# Altium schematic symbol library jlcpcb_2025_04_resistors_extended_2512.schlib: 2667 symbols (part 11 of 14) (continued)
## RTT25R51JTE
designator R?  Resistance: 510mΩ  (hidden comment: *)
Resistor, 510mΩ, ±5%, 1W, 200V, ±200ppm/℃, -55℃~+155℃, SMD 2512; Manufacturer: Uniroyal; Manufacturer Part Number: RTT25R51JTE; Supplier 1: LCSC; Supplier Part Number 1: C305119; JLCPCB Part Number: C305119; Power Rating: 1W; Category: Resistors; Package Size: 2512; JLCPCB Basic Part: Yes; Tolerance: ±5%; Voltage Rating: 200V; Temperature Coefficient: ±200ppm/℃; Temperature Rating: -55℃~+155℃; ComponentLink1Description: Datasheet; ComponentLink1URL: https://wmsc.lcsc.com/wmsc/upload/file/pdf/v2/lcsc/2304140030_RALEC-RTT25R51JTE_C305119.pdf; ComponentLink2Description: JLCPCB Part URL; ComponentLink2URL: https://jlcpcb.com/partdetail/C305119
pins: 1, 2
1 alternate drawing of the same symbol

## RTT25R060FTE
designator R?  Resistance: 60mΩ  (hidden comment: *)
Resistor, 60mΩ, ±1%, 1W, 200V, ±500ppm/℃, -55℃~+155℃, SMD 2512; Manufacturer: Uniroyal; Manufacturer Part Number: RTT25R060FTE; Supplier 1: LCSC; Supplier Part Number 1: C333702; JLCPCB Part Number: C333702; Power Rating: 1W; Category: Resistors; Package Size: 2512; JLCPCB Basic Part: Yes; Tolerance: ±1%; Voltage Rating: 200V; Temperature Coefficient: ±500ppm/℃; Temperature Rating: -55℃~+155℃; ComponentLink1Description: Datasheet; ComponentLink1URL: https://wmsc.lcsc.com/wmsc/upload/file/pdf/v2/lcsc/2304140030_RALEC-RTT25R060FTE_C333702.pdf; ComponentLink2Description: JLCPCB Part URL; ComponentLink2URL: https://jlcpcb.com/partdetail/C333702
pins: 1, 2
1 alternate drawing of the same symbol

## RTT25R062FTE
designator R?  Resistance: 62mΩ  (hidden comment: *)
Resistor, 62mΩ, ±1%, 1W, 200V, ±500ppm/℃, -55℃~+155℃, SMD 2512; Manufacturer: Uniroyal; Manufacturer Part Number: RTT25R062FTE; Supplier 1: LCSC; Supplier Part Number 1: C305116; JLCPCB Part Number: C305116; Power Rating: 1W; Category: Resistors; Package Size: 2512; JLCPCB Basic Part: Yes; Tolerance: ±1%; Voltage Rating: 200V; Temperature Coefficient: ±500ppm/℃; Temperature Rating: -55℃~+155℃; ComponentLink1Description: Datasheet; ComponentLink1URL: https://wmsc.lcsc.com/wmsc/upload/file/pdf/v2/lcsc/2304140030_RALEC-RTT25R062FTE_C305116.pdf; ComponentLink2Description: JLCPCB Part URL; ComponentLink2URL: https://jlcpcb.com/partdetail/C305116
pins: 1, 2
1 alternate drawing of the same symbol

## RTT25R62JTE
designator R?  Resistance: 620mΩ  (hidden comment: *)
Resistor, 620mΩ, ±5%, 1W, 200V, ±200ppm/℃, -55℃~+155℃, SMD 2512; Manufacturer: Uniroyal; Manufacturer Part Number: RTT25R62JTE; Supplier 1: LCSC; Supplier Part Number 1: C159154; JLCPCB Part Number: C159154; Power Rating: 1W; Category: Resistors; Package Size: 2512; JLCPCB Basic Part: Yes; Tolerance: ±5%; Voltage Rating: 200V; Temperature Coefficient: ±200ppm/℃; Temperature Rating: -55℃~+155℃; ComponentLink1Description: Datasheet; ComponentLink1URL: https://wmsc.lcsc.com/wmsc/upload/file/pdf/v2/lcsc/2304140030_RALEC-RTT25R62JTE_C159154.pdf; ComponentLink2Description: JLCPCB Part URL; ComponentLink2URL: https://jlcpcb.com/partdetail/C159154
pins: 1, 2
1 alternate drawing of the same symbol

## RTT25R068FTE
designator R?  Resistance: 68mΩ  (hidden comment: *)
Resistor, 68mΩ, ±1%, 1W, 200V, ±500ppm/℃, -55℃~+155℃, SMD 2512; Manufacturer: Uniroyal; Manufacturer Part Number: RTT25R068FTE; Supplier 1: LCSC; Supplier Part Number 1: C333703; JLCPCB Part Number: C333703; Power Rating: 1W; Category: Resistors; Package Size: 2512; JLCPCB Basic Part: Yes; Tolerance: ±1%; Voltage Rating: 200V; Temperature Coefficient: ±500ppm/℃; Temperature Rating: -55℃~+155℃; ComponentLink1Description: Datasheet; ComponentLink1URL: https://wmsc.lcsc.com/wmsc/upload/file/pdf/v2/lcsc/2304140030_RALEC-RTT25R068FTE_C333703.pdf; ComponentLink2Description: JLCPCB Part URL; ComponentLink2URL: https://jlcpcb.com/partdetail/C333703
pins: 1, 2
1 alternate drawing of the same symbol

## RTT25R68JTE
designator R?  Resistance: 680mΩ  (hidden comment: *)
Resistor, 680mΩ, ±5%, 1W, 200V, ±200ppm/℃, -55℃~+155℃, SMD 2512; Manufacturer: Uniroyal; Manufacturer Part Number: RTT25R68JTE; Supplier 1: LCSC; Supplier Part Number 1: C159153; JLCPCB Part Number: C159153; Power Rating: 1W; Category: Resistors; Package Size: 2512; JLCPCB Basic Part: Yes; Tolerance: ±5%; Voltage Rating: 200V; Temperature Coefficient: ±200ppm/℃; Temperature Rating: -55℃~+155℃; ComponentLink1Description: Datasheet; ComponentLink1URL: https://wmsc.lcsc.com/wmsc/upload/file/pdf/v2/lcsc/2304140030_RALEC-RTT25R68JTE_C159153.pdf; ComponentLink2Description: JLCPCB Part URL; ComponentLink2URL: https://jlcpcb.com/partdetail/C159153
pins: 1, 2
1 alternate drawing of the same symbol

## RTT25R075FTE
designator R?  Resistance: 75mΩ  (hidden comment: *)
Resistor, 75mΩ, ±1%, 1W, 200V, ±500ppm/℃, -55℃~+155℃, SMD 2512; Manufacturer: Uniroyal; Manufacturer Part Number: RTT25R075FTE; Supplier 1: LCSC; Supplier Part Number 1: C333704; JLCPCB Part Number: C333704; Power Rating: 1W; Category: Resistors; Package Size: 2512; JLCPCB Basic Part: Yes; Tolerance: ±1%; Voltage Rating: 200V; Temperature Coefficient: ±500ppm/℃; Temperature Rating: -55℃~+155℃; ComponentLink1Description: Datasheet; ComponentLink1URL: https://wmsc.lcsc.com/wmsc/upload/file/pdf/v2/lcsc/2304140030_RALEC-RTT25R075FTE_C333704.pdf; ComponentLink2Description: JLCPCB Part URL; ComponentLink2URL: https://jlcpcb.com/partdetail/C333704
pins: 1, 2
1 alternate drawing of the same symbol

## RTT25R75JTE
designator R?  Resistance: 750mΩ  (hidden comment: *)
Resistor, 750mΩ, ±5%, 1W, 200V, ±200ppm/℃, -55℃~+155℃, SMD 2512; Manufacturer: Uniroyal; Manufacturer Part Number: RTT25R75JTE; Supplier 1: LCSC; Supplier Part Number 1: C159152; JLCPCB Part Number: C159152; Power Rating: 1W; Category: Resistors; Package Size: 2512; JLCPCB Basic Part: Yes; Tolerance: ±5%; Voltage Rating: 200V; Temperature Coefficient: ±200ppm/℃; Temperature Rating: -55℃~+155℃; ComponentLink1Description: Datasheet; ComponentLink1URL: https://wmsc.lcsc.com/wmsc/upload/file/pdf/v2/lcsc/2304140030_RALEC-RTT25R75JTE_C159152.pdf; ComponentLink2Description: JLCPCB Part URL; ComponentLink2URL: https://jlcpcb.com/partdetail/C159152
pins: 1, 2
1 alternate drawing of the same symbol

## RTT25R080FTE
designator R?  Resistance: 80mΩ  (hidden comment: *)
Resistor, 80mΩ, ±1%, 1W, SMD 2512; Manufacturer: Uniroyal; Manufacturer Part Number: RTT25R080FTE; Supplier 1: LCSC; Supplier Part Number 1: C881749; JLCPCB Part Number: C881749; Power Rating: 1W; Category: Resistors; Package Size: 2512; JLCPCB Basic Part: Yes; Tolerance: ±1%; ComponentLink1Description: Datasheet; ComponentLink1URL: https://wmsc.lcsc.com/wmsc/upload/file/pdf/v2/lcsc/2304140030_RALEC-RTT25R080FTE_C881749.pdf; ComponentLink2Description: JLCPCB Part URL; ComponentLink2URL: https://jlcpcb.com/partdetail/C881749
pins: 1, 2
1 alternate drawing of the same symbol

## RTT25R082FTE
designator R?  Resistance: 82mΩ  (hidden comment: *)
Resistor, 82mΩ, ±1%, 1W, 200V, ±500ppm/℃, -55℃~+155℃, SMD 2512; Manufacturer: Uniroyal; Manufacturer Part Number: RTT25R082FTE; Supplier 1: LCSC; Supplier Part Number 1: C333706; JLCPCB Part Number: C333706; Power Rating: 1W; Category: Resistors; Package Size: 2512; JLCPCB Basic Part: Yes; Tolerance: ±1%; Voltage Rating: 200V; Temperature Coefficient: ±500ppm/℃; Temperature Rating: -55℃~+155℃; ComponentLink1Description: Datasheet; ComponentLink1URL: https://wmsc.lcsc.com/wmsc/upload/file/pdf/v2/lcsc/2304140030_RALEC-RTT25R082FTE_C333706.pdf; ComponentLink2Description: JLCPCB Part URL; ComponentLink2URL: https://jlcpcb.com/partdetail/C333706
pins: 1, 2
1 alternate drawing of the same symbol

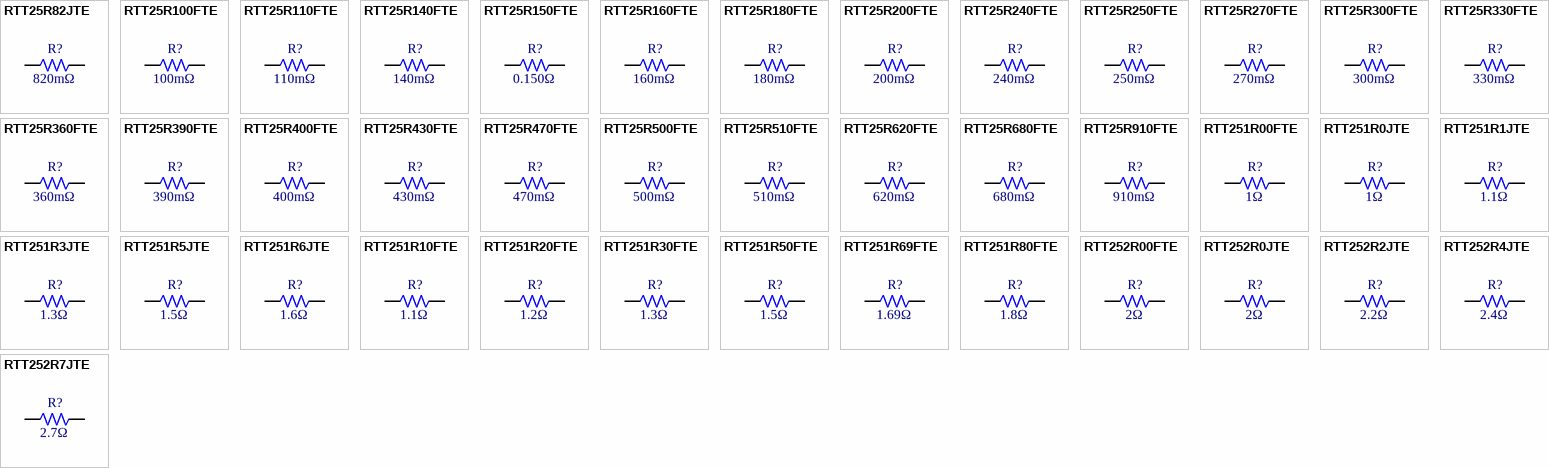
[diagram p54: symbols RTT25R82JTE to RTT252R7JTE]

## RTT25R82JTE
designator R?  Resistance: 820mΩ  (hidden comment: *)
Resistor, 820mΩ, ±5%, 1W, ±200ppm/℃, SMD 2512; Manufacturer: Uniroyal; Manufacturer Part Number: RTT25R82JTE; Supplier 1: LCSC; Supplier Part Number 1: C105152; JLCPCB Part Number: C105152; Power Rating: 1W; Category: Resistors; Package Size: 2512; JLCPCB Basic Part: Yes; Tolerance: ±5%; Temperature Coefficient: ±200ppm/℃; ComponentLink1Description: Datasheet; ComponentLink1URL: https://wmsc.lcsc.com/wmsc/upload/file/pdf/v2/lcsc/2304140030_RALEC-RTT25R82JTE_C105152.pdf; ComponentLink2Description: JLCPCB Part URL; ComponentLink2URL: https://jlcpcb.com/partdetail/C105152
pins: 1, 2
1 alternate drawing of the same symbol

## RTT25R100FTE
designator R?  Resistance: 100mΩ  (hidden comment: *)
Resistor, 100mΩ, ±1%, 1W, 200V, ±200ppm/℃, -55℃~+155℃, SMD 2512; Manufacturer: Uniroyal; Manufacturer Part Number: RTT25R100FTE; Supplier 1: LCSC; Supplier Part Number 1: C105145; JLCPCB Part Number: C105145; Power Rating: 1W; Category: Resistors; Package Size: 2512; JLCPCB Basic Part: Yes; Tolerance: ±1%; Voltage Rating: 200V; Temperature Coefficient: ±200ppm/℃; Temperature Rating: -55℃~+155℃; ComponentLink1Description: Datasheet; ComponentLink1URL: https://wmsc.lcsc.com/wmsc/upload/file/pdf/v2/lcsc/2304140030_RALEC-RTT25R100FTE_C105145.pdf; ComponentLink2Description: JLCPCB Part URL; ComponentLink2URL: https://jlcpcb.com/partdetail/C105145
pins: 1, 2
1 alternate drawing of the same symbol

## RTT25R110FTE
designator R?  Resistance: 110mΩ  (hidden comment: *)
Resistor, 110mΩ, ±1%, 1W, 200V, ±200ppm/℃, -55℃~+155℃, SMD 2512; Manufacturer: Uniroyal; Manufacturer Part Number: RTT25R110FTE; Supplier 1: LCSC; Supplier Part Number 1: C333708; JLCPCB Part Number: C333708; Power Rating: 1W; Category: Resistors; Package Size: 2512; JLCPCB Basic Part: Yes; Tolerance: ±1%; Voltage Rating: 200V; Temperature Coefficient: ±200ppm/℃; Temperature Rating: -55℃~+155℃; ComponentLink1Description: Datasheet; ComponentLink1URL: https://wmsc.lcsc.com/wmsc/upload/file/pdf/v2/lcsc/2304140030_RALEC-RTT25R110FTE_C333708.pdf; ComponentLink2Description: JLCPCB Part URL; ComponentLink2URL: https://jlcpcb.com/partdetail/C333708
pins: 1, 2
1 alternate drawing of the same symbol

## RTT25R140FTE
designator R?  Resistance: 140mΩ  (hidden comment: *)
Resistor, 140mΩ, ±1%, 1W, 200V, ±200ppm/℃, -55℃~+155℃, SMD 2512; Manufacturer: Uniroyal; Manufacturer Part Number: RTT25R140FTE; Supplier 1: LCSC; Supplier Part Number 1: C333710; JLCPCB Part Number: C333710; Power Rating: 1W; Category: Resistors; Package Size: 2512; JLCPCB Basic Part: Yes; Tolerance: ±1%; Voltage Rating: 200V; Temperature Coefficient: ±200ppm/℃; Temperature Rating: -55℃~+155℃; ComponentLink1Description: Datasheet; ComponentLink1URL: https://wmsc.lcsc.com/wmsc/upload/file/pdf/v2/lcsc/2304140030_RALEC-RTT25R140FTE_C333710.pdf; ComponentLink2Description: JLCPCB Part URL; ComponentLink2URL: https://jlcpcb.com/partdetail/C333710
pins: 1, 2
1 alternate drawing of the same symbol

## RTT25R150FTE
designator R?  Resistance: 0.150Ω  (hidden comment: *)
Resistor, 0.150Ω, ±1%, 1W, 200V, ±100ppm/℃, -55℃~+155℃, SMD 2512; Manufacturer: Uniroyal; Manufacturer Part Number: RTT25R150FTE; Supplier 1: LCSC; Supplier Part Number 1: C2991321; JLCPCB Part Number: C2991321; Power Rating: 1W; Category: Resistors; Package Size: 2512; JLCPCB Basic Part: Yes; Tolerance: ±1%; Voltage Rating: 200V; Temperature Coefficient: ±100ppm/℃; Temperature Rating: -55℃~+155℃; ComponentLink1Description: Datasheet; ComponentLink1URL: https://wmsc.lcsc.com/wmsc/upload/file/pdf/v2/lcsc/2204082130_RALEC-RTT25R150FTE_C2991321.pdf; ComponentLink2Description: JLCPCB Part URL; ComponentLink2URL: https://jlcpcb.com/partdetail/C2991321
pins: 1, 2
1 alternate drawing of the same symbol

## RTT25R160FTE
designator R?  Resistance: 160mΩ  (hidden comment: *)
Resistor, 160mΩ, ±1%, 1W, ±200ppm/℃, SMD 2512; Manufacturer: Uniroyal; Manufacturer Part Number: RTT25R160FTE; Supplier 1: LCSC; Supplier Part Number 1: C333711; JLCPCB Part Number: C333711; Power Rating: 1W; Category: Resistors; Package Size: 2512; JLCPCB Basic Part: Yes; Tolerance: ±1%; Temperature Coefficient: ±200ppm/℃; ComponentLink1Description: Datasheet; ComponentLink1URL: https://wmsc.lcsc.com/wmsc/upload/file/pdf/v2/lcsc/2304140030_RALEC-RTT25R160FTE_C333711.pdf; ComponentLink2Description: JLCPCB Part URL; ComponentLink2URL: https://jlcpcb.com/partdetail/C333711
pins: 1, 2
1 alternate drawing of the same symbol

## RTT25R180FTE
designator R?  Resistance: 180mΩ  (hidden comment: *)
Resistor, 180mΩ, ±1%, 1W, 200V, ±200ppm/℃, -55℃~+155℃, SMD 2512; Manufacturer: Uniroyal; Manufacturer Part Number: RTT25R180FTE; Supplier 1: LCSC; Supplier Part Number 1: C333712; JLCPCB Part Number: C333712; Power Rating: 1W; Category: Resistors; Package Size: 2512; JLCPCB Basic Part: Yes; Tolerance: ±1%; Voltage Rating: 200V; Temperature Coefficient: ±200ppm/℃; Temperature Rating: -55℃~+155℃; ComponentLink1Description: Datasheet; ComponentLink1URL: https://wmsc.lcsc.com/wmsc/upload/file/pdf/v2/lcsc/2304140030_RALEC-RTT25R180FTE_C333712.pdf; ComponentLink2Description: JLCPCB Part URL; ComponentLink2URL: https://jlcpcb.com/partdetail/C333712
pins: 1, 2
1 alternate drawing of the same symbol

## RTT25R200FTE
designator R?  Resistance: 200mΩ  (hidden comment: *)
Resistor, 200mΩ, ±1%, 1W, 200V, ±200ppm/℃, -55℃~+155℃, SMD 2512; Manufacturer: Uniroyal; Manufacturer Part Number: RTT25R200FTE; Supplier 1: LCSC; Supplier Part Number 1: C159164; JLCPCB Part Number: C159164; Power Rating: 1W; Category: Resistors; Package Size: 2512; JLCPCB Basic Part: Yes; Tolerance: ±1%; Voltage Rating: 200V; Temperature Coefficient: ±200ppm/℃; Temperature Rating: -55℃~+155℃; ComponentLink1Description: Datasheet; ComponentLink1URL: https://wmsc.lcsc.com/wmsc/upload/file/pdf/v2/lcsc/2304140030_RALEC-RTT25R200FTE_C159164.pdf; ComponentLink2Description: JLCPCB Part URL; ComponentLink2URL: https://jlcpcb.com/partdetail/C159164
pins: 1, 2
1 alternate drawing of the same symbol

## RTT25R240FTE
designator R?  Resistance: 240mΩ  (hidden comment: *)
Resistor, 240mΩ, ±1%, 1W, 200V, ±200ppm/℃, -55℃~+155℃, SMD 2512; Manufacturer: Uniroyal; Manufacturer Part Number: RTT25R240FTE; Supplier 1: LCSC; Supplier Part Number 1: C333715; JLCPCB Part Number: C333715; Power Rating: 1W; Category: Resistors; Package Size: 2512; JLCPCB Basic Part: Yes; Tolerance: ±1%; Voltage Rating: 200V; Temperature Coefficient: ±200ppm/℃; Temperature Rating: -55℃~+155℃; ComponentLink1Description: Datasheet; ComponentLink1URL: https://wmsc.lcsc.com/wmsc/upload/file/pdf/v2/lcsc/2304140030_RALEC-RTT25R240FTE_C333715.pdf; ComponentLink2Description: JLCPCB Part URL; ComponentLink2URL: https://jlcpcb.com/partdetail/C333715
pins: 1, 2
1 alternate drawing of the same symbol

## RTT25R250FTE
designator R?  Resistance: 250mΩ  (hidden comment: *)
Resistor, 250mΩ, ±1%, 1W, ±200ppm/℃, SMD 2512; Manufacturer: Uniroyal; Manufacturer Part Number: RTT25R250FTE; Supplier 1: LCSC; Supplier Part Number 1: C105146; JLCPCB Part Number: C105146; Power Rating: 1W; Category: Resistors; Package Size: 2512; JLCPCB Basic Part: Yes; Tolerance: ±1%; Temperature Coefficient: ±200ppm/℃; ComponentLink1Description: Datasheet; ComponentLink1URL: https://wmsc.lcsc.com/wmsc/upload/file/pdf/v2/lcsc/2304140030_RALEC-RTT25R250FTE_C105146.pdf; ComponentLink2Description: JLCPCB Part URL; ComponentLink2URL: https://jlcpcb.com/partdetail/C105146
pins: 1, 2
1 alternate drawing of the same symbol

## RTT25R270FTE
designator R?  Resistance: 270mΩ  (hidden comment: *)
Resistor, 270mΩ, ±1%, 1W, 200V, ±200ppm/℃, -55℃~+155℃, SMD 2512; Manufacturer: Uniroyal; Manufacturer Part Number: RTT25R270FTE; Supplier 1: LCSC; Supplier Part Number 1: C333716; JLCPCB Part Number: C333716; Power Rating: 1W; Category: Resistors; Package Size: 2512; JLCPCB Basic Part: Yes; Tolerance: ±1%; Voltage Rating: 200V; Temperature Coefficient: ±200ppm/℃; Temperature Rating: -55℃~+155℃; ComponentLink1Description: Datasheet; ComponentLink1URL: https://wmsc.lcsc.com/wmsc/upload/file/pdf/v2/lcsc/2304140030_RALEC-RTT25R270FTE_C333716.pdf; ComponentLink2Description: JLCPCB Part URL; ComponentLink2URL: https://jlcpcb.com/partdetail/C333716
pins: 1, 2
1 alternate drawing of the same symbol

## RTT25R300FTE
designator R?  Resistance: 300mΩ  (hidden comment: *)
Resistor, 300mΩ, ±1%, 1W, ±200ppm/℃, SMD 2512; Manufacturer: Uniroyal; Manufacturer Part Number: RTT25R300FTE; Supplier 1: LCSC; Supplier Part Number 1: C159162; JLCPCB Part Number: C159162; Power Rating: 1W; Category: Resistors; Package Size: 2512; JLCPCB Basic Part: Yes; Tolerance: ±1%; Temperature Coefficient: ±200ppm/℃; ComponentLink1Description: Datasheet; ComponentLink1URL: https://wmsc.lcsc.com/wmsc/upload/file/pdf/v2/lcsc/2304140030_RALEC-RTT25R300FTE_C159162.pdf; ComponentLink2Description: JLCPCB Part URL; ComponentLink2URL: https://jlcpcb.com/partdetail/C159162
pins: 1, 2
1 alternate drawing of the same symbol

## RTT25R330FTE
designator R?  Resistance: 330mΩ  (hidden comment: *)
Resistor, 330mΩ, ±1%, 1W, ±200ppm/℃, SMD 2512; Manufacturer: Uniroyal; Manufacturer Part Number: RTT25R330FTE; Supplier 1: LCSC; Supplier Part Number 1: C105147; JLCPCB Part Number: C105147; Power Rating: 1W; Category: Resistors; Package Size: 2512; JLCPCB Basic Part: Yes; Tolerance: ±1%; Temperature Coefficient: ±200ppm/℃; ComponentLink1Description: Datasheet; ComponentLink1URL: https://wmsc.lcsc.com/wmsc/upload/file/pdf/v2/lcsc/2304140030_RALEC-RTT25R330FTE_C105147.pdf; ComponentLink2Description: JLCPCB Part URL; ComponentLink2URL: https://jlcpcb.com/partdetail/C105147
pins: 1, 2
1 alternate drawing of the same symbol

## RTT25R360FTE
designator R?  Resistance: 360mΩ  (hidden comment: *)
Resistor, 360mΩ, ±1%, 1W, 200V, ±200ppm/℃, -55℃~+155℃, SMD 2512; Manufacturer: Uniroyal; Manufacturer Part Number: RTT25R360FTE; Supplier 1: LCSC; Supplier Part Number 1: C333717; JLCPCB Part Number: C333717; Power Rating: 1W; Category: Resistors; Package Size: 2512; JLCPCB Basic Part: Yes; Tolerance: ±1%; Voltage Rating: 200V; Temperature Coefficient: ±200ppm/℃; Temperature Rating: -55℃~+155℃; ComponentLink1Description: Datasheet; ComponentLink1URL: https://wmsc.lcsc.com/wmsc/upload/file/pdf/v2/lcsc/2304140030_RALEC-RTT25R360FTE_C333717.pdf; ComponentLink2Description: JLCPCB Part URL; ComponentLink2URL: https://jlcpcb.com/partdetail/C333717
pins: 1, 2
1 alternate drawing of the same symbol

## RTT25R390FTE
designator R?  Resistance: 390mΩ  (hidden comment: *)
Resistor, 390mΩ, ±1%, 1W, 200V, ±200ppm/℃, -55℃~+155℃, SMD 2512; Manufacturer: Uniroyal; Manufacturer Part Number: RTT25R390FTE; Supplier 1: LCSC; Supplier Part Number 1: C159159; JLCPCB Part Number: C159159; Power Rating: 1W; Category: Resistors; Package Size: 2512; JLCPCB Basic Part: Yes; Tolerance: ±1%; Voltage Rating: 200V; Temperature Coefficient: ±200ppm/℃; Temperature Rating: -55℃~+155℃; ComponentLink1Description: Datasheet; ComponentLink1URL: https://wmsc.lcsc.com/wmsc/upload/file/pdf/v2/lcsc/2304140030_RALEC-RTT25R390FTE_C159159.pdf; ComponentLink2Description: JLCPCB Part URL; ComponentLink2URL: https://jlcpcb.com/partdetail/C159159
pins: 1, 2
1 alternate drawing of the same symbol

## RTT25R400FTE
designator R?  Resistance: 400mΩ  (hidden comment: *)
Resistor, 400mΩ, ±1%, SMD 2512; Manufacturer: Uniroyal; Manufacturer Part Number: RTT25R400FTE; Supplier 1: LCSC; Supplier Part Number 1: C159157; JLCPCB Part Number: C159157; Category: Resistors; Package Size: 2512; JLCPCB Basic Part: Yes; Tolerance: ±1%; ComponentLink1Description: Datasheet; ComponentLink1URL: https://wmsc.lcsc.com/wmsc/upload/file/pdf/v2/lcsc/2204121115_RALEC-RTT25R400FTE_C159157.pdf; ComponentLink2Description: JLCPCB Part URL; ComponentLink2URL: https://jlcpcb.com/partdetail/C159157
pins: 1, 2
1 alternate drawing of the same symbol

## RTT25R430FTE
designator R?  Resistance: 430mΩ  (hidden comment: *)
Resistor, 430mΩ, ±1%, 1W, 200V, ±200ppm/℃, -55℃~+155℃, SMD 2512; Manufacturer: Uniroyal; Manufacturer Part Number: RTT25R430FTE; Supplier 1: LCSC; Supplier Part Number 1: C333719; JLCPCB Part Number: C333719; Power Rating: 1W; Category: Resistors; Package Size: 2512; JLCPCB Basic Part: Yes; Tolerance: ±1%; Voltage Rating: 200V; Temperature Coefficient: ±200ppm/℃; Temperature Rating: -55℃~+155℃; ComponentLink1Description: Datasheet; ComponentLink1URL: https://wmsc.lcsc.com/wmsc/upload/file/pdf/v2/lcsc/2304140030_RALEC-RTT25R430FTE_C333719.pdf; ComponentLink2Description: JLCPCB Part URL; ComponentLink2URL: https://jlcpcb.com/partdetail/C333719
pins: 1, 2
1 alternate drawing of the same symbol

## RTT25R470FTE
designator R?  Resistance: 470mΩ  (hidden comment: *)
Resistor, 470mΩ, ±1%, 1W, 200V, ±200ppm/℃, -55℃~+155℃, SMD 2512; Manufacturer: Uniroyal; Manufacturer Part Number: RTT25R470FTE; Supplier 1: LCSC; Supplier Part Number 1: C105148; JLCPCB Part Number: C105148; Power Rating: 1W; Category: Resistors; Package Size: 2512; JLCPCB Basic Part: Yes; Tolerance: ±1%; Voltage Rating: 200V; Temperature Coefficient: ±200ppm/℃; Temperature Rating: -55℃~+155℃; ComponentLink1Description: Datasheet; ComponentLink1URL: https://wmsc.lcsc.com/wmsc/upload/file/pdf/v2/lcsc/2304140030_RALEC-RTT25R470FTE_C105148.pdf; ComponentLink2Description: JLCPCB Part URL; ComponentLink2URL: https://jlcpcb.com/partdetail/C105148
pins: 1, 2
1 alternate drawing of the same symbol

## RTT25R500FTE
designator R?  Resistance: 500mΩ  (hidden comment: *)
Resistor, 500mΩ, ±1%, 1W, ±200ppm/℃, SMD 2512; Manufacturer: Uniroyal; Manufacturer Part Number: RTT25R500FTE; Supplier 1: LCSC; Supplier Part Number 1: C105149; JLCPCB Part Number: C105149; Power Rating: 1W; Category: Resistors; Package Size: 2512; JLCPCB Basic Part: Yes; Tolerance: ±1%; Temperature Coefficient: ±200ppm/℃; ComponentLink1Description: Datasheet; ComponentLink1URL: https://wmsc.lcsc.com/wmsc/upload/file/pdf/v2/lcsc/2304140030_RALEC-RTT25R500FTE_C105149.pdf; ComponentLink2Description: JLCPCB Part URL; ComponentLink2URL: https://jlcpcb.com/partdetail/C105149
pins: 1, 2
1 alternate drawing of the same symbol

## RTT25R510FTE
designator R?  Resistance: 510mΩ  (hidden comment: *)
Resistor, 510mΩ, ±1%, 1W, 200V, ±200ppm/℃, -55℃~+155℃, SMD 2512; Manufacturer: Uniroyal; Manufacturer Part Number: RTT25R510FTE; Supplier 1: LCSC; Supplier Part Number 1: C159155; JLCPCB Part Number: C159155; Power Rating: 1W; Category: Resistors; Package Size: 2512; JLCPCB Basic Part: Yes; Tolerance: ±1%; Voltage Rating: 200V; Temperature Coefficient: ±200ppm/℃; Temperature Rating: -55℃~+155℃; ComponentLink1Description: Datasheet; ComponentLink1URL: https://wmsc.lcsc.com/wmsc/upload/file/pdf/v2/lcsc/2304140030_RALEC-RTT25R510FTE_C159155.pdf; ComponentLink2Description: JLCPCB Part URL; ComponentLink2URL: https://jlcpcb.com/partdetail/C159155
pins: 1, 2
1 alternate drawing of the same symbol

## RTT25R620FTE
designator R?  Resistance: 620mΩ  (hidden comment: *)
Resistor, 620mΩ, ±1%, 1W, 200V, ±200ppm/℃, -55℃~+155℃, SMD 2512; Manufacturer: Uniroyal; Manufacturer Part Number: RTT25R620FTE; Supplier 1: LCSC; Supplier Part Number 1: C105150; JLCPCB Part Number: C105150; Power Rating: 1W; Category: Resistors; Package Size: 2512; JLCPCB Basic Part: Yes; Tolerance: ±1%; Voltage Rating: 200V; Temperature Coefficient: ±200ppm/℃; Temperature Rating: -55℃~+155℃; ComponentLink1Description: Datasheet; ComponentLink1URL: https://wmsc.lcsc.com/wmsc/upload/file/pdf/v2/lcsc/2304140030_RALEC-RTT25R620FTE_C105150.pdf; ComponentLink2Description: JLCPCB Part URL; ComponentLink2URL: https://jlcpcb.com/partdetail/C105150
pins: 1, 2
1 alternate drawing of the same symbol

## RTT25R680FTE
designator R?  Resistance: 680mΩ  (hidden comment: *)
Resistor, 680mΩ, ±1%, 1W, 200V, ±200ppm/℃, -55℃~+155℃, SMD 2512; Manufacturer: Uniroyal; Manufacturer Part Number: RTT25R680FTE; Supplier 1: LCSC; Supplier Part Number 1: C105151; JLCPCB Part Number: C105151; Power Rating: 1W; Category: Resistors; Package Size: 2512; JLCPCB Basic Part: Yes; Tolerance: ±1%; Voltage Rating: 200V; Temperature Coefficient: ±200ppm/℃; Temperature Rating: -55℃~+155℃; ComponentLink1Description: Datasheet; ComponentLink1URL: https://wmsc.lcsc.com/wmsc/upload/file/pdf/v2/lcsc/2304140030_RALEC-RTT25R680FTE_C105151.pdf; ComponentLink2Description: JLCPCB Part URL; ComponentLink2URL: https://jlcpcb.com/partdetail/C105151
pins: 1, 2
1 alternate drawing of the same symbol

## RTT25R910FTE
designator R?  Resistance: 910mΩ  (hidden comment: *)
Resistor, 910mΩ, ±1%, 1W, 200V, ±200ppm/℃, -55℃~+155℃, SMD 2512; Manufacturer: Uniroyal; Manufacturer Part Number: RTT25R910FTE; Supplier 1: LCSC; Supplier Part Number 1: C159194; JLCPCB Part Number: C159194; Power Rating: 1W; Category: Resistors; Package Size: 2512; JLCPCB Basic Part: Yes; Tolerance: ±1%; Voltage Rating: 200V; Temperature Coefficient: ±200ppm/℃; Temperature Rating: -55℃~+155℃; ComponentLink1Description: Datasheet; ComponentLink1URL: https://wmsc.lcsc.com/wmsc/upload/file/pdf/v2/lcsc/2304140030_RALEC-RTT25R910FTE_C159194.pdf; ComponentLink2Description: JLCPCB Part URL; ComponentLink2URL: https://jlcpcb.com/partdetail/C159194
pins: 1, 2
1 alternate drawing of the same symbol

## RTT251R00FTE
designator R?  Resistance: 1Ω  (hidden comment: *)
Resistor, 1Ω, ±1%, 1W, 200V, ±200ppm/℃, -55℃~+155℃, SMD 2512; Manufacturer: Uniroyal; Manufacturer Part Number: RTT251R00FTE; Supplier 1: LCSC; Supplier Part Number 1: C105082; JLCPCB Part Number: C105082; Power Rating: 1W; Category: Resistors; Package Size: 2512; JLCPCB Basic Part: Yes; Tolerance: ±1%; Voltage Rating: 200V; Temperature Coefficient: ±200ppm/℃; Temperature Rating: -55℃~+155℃; ComponentLink1Description: Datasheet; ComponentLink1URL: https://wmsc.lcsc.com/wmsc/upload/file/pdf/v2/lcsc/2304140030_RALEC-RTT251R00FTE_C105082.pdf; ComponentLink2Description: JLCPCB Part URL; ComponentLink2URL: https://jlcpcb.com/partdetail/C105082
pins: 1, 2
1 alternate drawing of the same symbol

## RTT251R0JTE
designator R?  Resistance: 1Ω  (hidden comment: *)
Resistor, 1Ω, ±5%, 1W, ±200ppm/℃, SMD 2512; Manufacturer: Uniroyal; Manufacturer Part Number: RTT251R0JTE; Supplier 1: LCSC; Supplier Part Number 1: C105083; JLCPCB Part Number: C105083; Power Rating: 1W; Category: Resistors; Package Size: 2512; JLCPCB Basic Part: Yes; Tolerance: ±5%; Temperature Coefficient: ±200ppm/℃; ComponentLink1Description: Datasheet; ComponentLink1URL: https://wmsc.lcsc.com/wmsc/upload/file/pdf/v2/lcsc/2304140030_RALEC-RTT251R0JTE_C105083.pdf; ComponentLink2Description: JLCPCB Part URL; ComponentLink2URL: https://jlcpcb.com/partdetail/C105083
pins: 1, 2
1 alternate drawing of the same symbol

## RTT251R1JTE
designator R?  Resistance: 1.1Ω  (hidden comment: *)
Resistor, 1.1Ω, ±5%, 1W, 200V, ±200ppm/℃, -55℃~+155℃, SMD 2512; Manufacturer: Uniroyal; Manufacturer Part Number: RTT251R1JTE; Supplier 1: LCSC; Supplier Part Number 1: C105084; JLCPCB Part Number: C105084; Power Rating: 1W; Category: Resistors; Package Size: 2512; JLCPCB Basic Part: Yes; Tolerance: ±5%; Voltage Rating: 200V; Temperature Coefficient: ±200ppm/℃; Temperature Rating: -55℃~+155℃; ComponentLink1Description: Datasheet; ComponentLink1URL: https://wmsc.lcsc.com/wmsc/upload/file/pdf/v2/lcsc/2304140030_RALEC-RTT251R1JTE_C105084.pdf; ComponentLink2Description: JLCPCB Part URL; ComponentLink2URL: https://jlcpcb.com/partdetail/C105084
pins: 1, 2
1 alternate drawing of the same symbol

## RTT251R3JTE
designator R?  Resistance: 1.3Ω  (hidden comment: *)
Resistor, 1.3Ω, ±5%, 1W, 200V, ±200ppm/℃, -55℃~+155℃, SMD 2512; Manufacturer: Uniroyal; Manufacturer Part Number: RTT251R3JTE; Supplier 1: LCSC; Supplier Part Number 1: C333549; JLCPCB Part Number: C333549; Power Rating: 1W; Category: Resistors; Package Size: 2512; JLCPCB Basic Part: Yes; Tolerance: ±5%; Voltage Rating: 200V; Temperature Coefficient: ±200ppm/℃; Temperature Rating: -55℃~+155℃; ComponentLink1Description: Datasheet; ComponentLink1URL: https://wmsc.lcsc.com/wmsc/upload/file/pdf/v2/lcsc/2304140030_RALEC-RTT251R3JTE_C333549.pdf; ComponentLink2Description: JLCPCB Part URL; ComponentLink2URL: https://jlcpcb.com/partdetail/C333549
pins: 1, 2
1 alternate drawing of the same symbol

## RTT251R5JTE
designator R?  Resistance: 1.5Ω  (hidden comment: *)
Resistor, 1.5Ω, ±5%, 1W, 200V, ±200ppm/℃, -55℃~+155℃, SMD 2512; Manufacturer: Uniroyal; Manufacturer Part Number: RTT251R5JTE; Supplier 1: LCSC; Supplier Part Number 1: C458705; JLCPCB Part Number: C458705; Power Rating: 1W; Category: Resistors; Package Size: 2512; JLCPCB Basic Part: Yes; Tolerance: ±5%; Voltage Rating: 200V; Temperature Coefficient: ±200ppm/℃; Temperature Rating: -55℃~+155℃; ComponentLink1Description: Datasheet; ComponentLink1URL: https://wmsc.lcsc.com/wmsc/upload/file/pdf/v2/lcsc/2304140030_RALEC-RTT251R5JTE_C458705.pdf; ComponentLink2Description: JLCPCB Part URL; ComponentLink2URL: https://jlcpcb.com/partdetail/C458705
pins: 1, 2
1 alternate drawing of the same symbol

## RTT251R6JTE
designator R?  Resistance: 1.6Ω  (hidden comment: *)
Resistor, 1.6Ω, ±5%, 1W, 200V, ±200ppm/℃, -55℃~+155℃, SMD 2512; Manufacturer: Uniroyal; Manufacturer Part Number: RTT251R6JTE; Supplier 1: LCSC; Supplier Part Number 1: C305093; JLCPCB Part Number: C305093; Power Rating: 1W; Category: Resistors; Package Size: 2512; JLCPCB Basic Part: Yes; Tolerance: ±5%; Voltage Rating: 200V; Temperature Coefficient: ±200ppm/℃; Temperature Rating: -55℃~+155℃; ComponentLink1Description: Datasheet; ComponentLink1URL: https://wmsc.lcsc.com/wmsc/upload/file/pdf/v2/lcsc/2304140030_RALEC-RTT251R6JTE_C305093.pdf; ComponentLink2Description: JLCPCB Part URL; ComponentLink2URL: https://jlcpcb.com/partdetail/C305093
pins: 1, 2
1 alternate drawing of the same symbol

## RTT251R10FTE
designator R?  Resistance: 1.1Ω  (hidden comment: *)
Resistor, 1.1Ω, ±1%, 1W, 200V, ±200ppm/℃, -55℃~+155℃, SMD 2512; Manufacturer: Uniroyal; Manufacturer Part Number: RTT251R10FTE; Supplier 1: LCSC; Supplier Part Number 1: C333546; JLCPCB Part Number: C333546; Power Rating: 1W; Category: Resistors; Package Size: 2512; JLCPCB Basic Part: Yes; Tolerance: ±1%; Voltage Rating: 200V; Temperature Coefficient: ±200ppm/℃; Temperature Rating: -55℃~+155℃; ComponentLink1Description: Datasheet; ComponentLink1URL: https://wmsc.lcsc.com/wmsc/upload/file/pdf/v2/lcsc/2304140030_RALEC-RTT251R10FTE_C333546.pdf; ComponentLink2Description: JLCPCB Part URL; ComponentLink2URL: https://jlcpcb.com/partdetail/C333546
pins: 1, 2
1 alternate drawing of the same symbol

## RTT251R20FTE
designator R?  Resistance: 1.2Ω  (hidden comment: *)
Resistor, 1.2Ω, ±1%, 1W, 200V, ±200ppm/℃, -55℃~+155℃, SMD 2512; Manufacturer: Uniroyal; Manufacturer Part Number: RTT251R20FTE; Supplier 1: LCSC; Supplier Part Number 1: C105085; JLCPCB Part Number: C105085; Power Rating: 1W; Category: Resistors; Package Size: 2512; JLCPCB Basic Part: Yes; Tolerance: ±1%; Voltage Rating: 200V; Temperature Coefficient: ±200ppm/℃; Temperature Rating: -55℃~+155℃; ComponentLink1Description: Datasheet; ComponentLink1URL: https://wmsc.lcsc.com/wmsc/upload/file/pdf/v2/lcsc/2304140030_RALEC-RTT251R20FTE_C105085.pdf; ComponentLink2Description: JLCPCB Part URL; ComponentLink2URL: https://jlcpcb.com/partdetail/C105085
pins: 1, 2
1 alternate drawing of the same symbol

## RTT251R30FTE
designator R?  Resistance: 1.3Ω  (hidden comment: *)
Resistor, 1.3Ω, ±1%, 1W, 200V, ±200ppm/℃, -55℃~+155℃, SMD 2512; Manufacturer: Uniroyal; Manufacturer Part Number: RTT251R30FTE; Supplier 1: LCSC; Supplier Part Number 1: C333548; JLCPCB Part Number: C333548; Power Rating: 1W; Category: Resistors; Package Size: 2512; JLCPCB Basic Part: Yes; Tolerance: ±1%; Voltage Rating: 200V; Temperature Coefficient: ±200ppm/℃; Temperature Rating: -55℃~+155℃; ComponentLink1Description: Datasheet; ComponentLink1URL: https://wmsc.lcsc.com/wmsc/upload/file/pdf/v2/lcsc/2304140030_RALEC-RTT251R30FTE_C333548.pdf; ComponentLink2Description: JLCPCB Part URL; ComponentLink2URL: https://jlcpcb.com/partdetail/C333548
pins: 1, 2
1 alternate drawing of the same symbol

## RTT251R50FTE
designator R?  Resistance: 1.5Ω  (hidden comment: *)
Resistor, 1.5Ω, ±1%, 1W, 200V, ±200ppm/℃, -55℃~+155℃, SMD 2512; Manufacturer: Uniroyal; Manufacturer Part Number: RTT251R50FTE; Supplier 1: LCSC; Supplier Part Number 1: C333550; JLCPCB Part Number: C333550; Power Rating: 1W; Category: Resistors; Package Size: 2512; JLCPCB Basic Part: Yes; Tolerance: ±1%; Voltage Rating: 200V; Temperature Coefficient: ±200ppm/℃; Temperature Rating: -55℃~+155℃; ComponentLink1Description: Datasheet; ComponentLink1URL: https://wmsc.lcsc.com/wmsc/upload/file/pdf/v2/lcsc/2304140030_RALEC-RTT251R50FTE_C333550.pdf; ComponentLink2Description: JLCPCB Part URL; ComponentLink2URL: https://jlcpcb.com/partdetail/C333550
pins: 1, 2
1 alternate drawing of the same symbol

## RTT251R69FTE
designator R?  Resistance: 1.69Ω  (hidden comment: *)
Resistor, 1.69Ω, ±1%, 1W, 200V, ±200ppm/℃, -55℃~+155℃, SMD 2512; Manufacturer: Uniroyal; Manufacturer Part Number: RTT251R69FTE; Supplier 1: LCSC; Supplier Part Number 1: C333551; JLCPCB Part Number: C333551; Power Rating: 1W; Category: Resistors; Package Size: 2512; JLCPCB Basic Part: Yes; Tolerance: ±1%; Voltage Rating: 200V; Temperature Coefficient: ±200ppm/℃; Temperature Rating: -55℃~+155℃; ComponentLink1Description: Datasheet; ComponentLink1URL: https://wmsc.lcsc.com/wmsc/upload/file/pdf/v2/lcsc/2304140030_RALEC-RTT251R69FTE_C333551.pdf; ComponentLink2Description: JLCPCB Part URL; ComponentLink2URL: https://jlcpcb.com/partdetail/C333551
pins: 1, 2
1 alternate drawing of the same symbol

## RTT251R80FTE
designator R?  Resistance: 1.8Ω  (hidden comment: *)
Resistor, 1.8Ω, ±1%, 1W, 200V, ±200ppm/℃, -55℃~+155℃, SMD 2512; Manufacturer: Uniroyal; Manufacturer Part Number: RTT251R80FTE; Supplier 1: LCSC; Supplier Part Number 1: C333552; JLCPCB Part Number: C333552; Power Rating: 1W; Category: Resistors; Package Size: 2512; JLCPCB Basic Part: Yes; Tolerance: ±1%; Voltage Rating: 200V; Temperature Coefficient: ±200ppm/℃; Temperature Rating: -55℃~+155℃; ComponentLink1Description: Datasheet; ComponentLink1URL: https://wmsc.lcsc.com/wmsc/upload/file/pdf/v2/lcsc/2304140030_RALEC-RTT251R80FTE_C333552.pdf; ComponentLink2Description: JLCPCB Part URL; ComponentLink2URL: https://jlcpcb.com/partdetail/C333552
pins: 1, 2
1 alternate drawing of the same symbol

## RTT252R00FTE
designator R?  Resistance: 2Ω  (hidden comment: *)
Resistor, 2Ω, ±1%, 1W, 200V, ±200ppm/℃, -55℃~+155℃, SMD 2512; Manufacturer: Uniroyal; Manufacturer Part Number: RTT252R00FTE; Supplier 1: LCSC; Supplier Part Number 1: C105100; JLCPCB Part Number: C105100; Power Rating: 1W; Category: Resistors; Package Size: 2512; JLCPCB Basic Part: Yes; Tolerance: ±1%; Voltage Rating: 200V; Temperature Coefficient: ±200ppm/℃; Temperature Rating: -55℃~+155℃; ComponentLink1Description: Datasheet; ComponentLink1URL: https://wmsc.lcsc.com/wmsc/upload/file/pdf/v2/lcsc/2304140030_RALEC-RTT252R00FTE_C105100.pdf; ComponentLink2Description: JLCPCB Part URL; ComponentLink2URL: https://jlcpcb.com/partdetail/C105100
pins: 1, 2
1 alternate drawing of the same symbol

## RTT252R0JTE
designator R?  Resistance: 2Ω  (hidden comment: *)
Resistor, 2Ω, ±5%, 1W, 200V, ±200ppm/℃, -55℃~+155℃, SMD 2512; Manufacturer: Uniroyal; Manufacturer Part Number: RTT252R0JTE; Supplier 1: LCSC; Supplier Part Number 1: C105101; JLCPCB Part Number: C105101; Power Rating: 1W; Category: Resistors; Package Size: 2512; JLCPCB Basic Part: Yes; Tolerance: ±5%; Voltage Rating: 200V; Temperature Coefficient: ±200ppm/℃; Temperature Rating: -55℃~+155℃; ComponentLink1Description: Datasheet; ComponentLink1URL: https://wmsc.lcsc.com/wmsc/upload/file/pdf/v2/lcsc/2304140030_RALEC-RTT252R0JTE_C105101.pdf; ComponentLink2Description: JLCPCB Part URL; ComponentLink2URL: https://jlcpcb.com/partdetail/C105101
pins: 1, 2
1 alternate drawing of the same symbol

## RTT252R2JTE
designator R?  Resistance: 2.2Ω  (hidden comment: *)
Resistor, 2.2Ω, ±5%, 1W, 200V, ±200ppm/℃, -55℃~+155℃, SMD 2512; Manufacturer: Uniroyal; Manufacturer Part Number: RTT252R2JTE; Supplier 1: LCSC; Supplier Part Number 1: C105102; JLCPCB Part Number: C105102; Power Rating: 1W; Category: Resistors; Package Size: 2512; JLCPCB Basic Part: Yes; Tolerance: ±5%; Voltage Rating: 200V; Temperature Coefficient: ±200ppm/℃; Temperature Rating: -55℃~+155℃; ComponentLink1Description: Datasheet; ComponentLink1URL: https://wmsc.lcsc.com/wmsc/upload/file/pdf/v2/lcsc/2304140030_RALEC-RTT252R2JTE_C105102.pdf; ComponentLink2Description: JLCPCB Part URL; ComponentLink2URL: https://jlcpcb.com/partdetail/C105102
pins: 1, 2
1 alternate drawing of the same symbol

## RTT252R4JTE
designator R?  Resistance: 2.4Ω  (hidden comment: *)
Resistor, 2.4Ω, ±5%, 1W, 200V, ±200ppm/℃, -55℃~+155℃, SMD 2512; Manufacturer: Uniroyal; Manufacturer Part Number: RTT252R4JTE; Supplier 1: LCSC; Supplier Part Number 1: C303755; JLCPCB Part Number: C303755; Power Rating: 1W; Category: Resistors; Package Size: 2512; JLCPCB Basic Part: Yes; Tolerance: ±5%; Voltage Rating: 200V; Temperature Coefficient: ±200ppm/℃; Temperature Rating: -55℃~+155℃; ComponentLink1Description: Datasheet; ComponentLink1URL: https://wmsc.lcsc.com/wmsc/upload/file/pdf/v2/lcsc/2304140030_RALEC-RTT252R4JTE_C303755.pdf; ComponentLink2Description: JLCPCB Part URL; ComponentLink2URL: https://jlcpcb.com/partdetail/C303755
pins: 1, 2
1 alternate drawing of the same symbol

## RTT252R7JTE
designator R?  Resistance: 2.7Ω  (hidden comment: *)
Resistor, 2.7Ω, ±5%, 1W, 200V, ±200ppm/℃, -55℃~+155℃, SMD 2512; Manufacturer: Uniroyal; Manufacturer Part Number: RTT252R7JTE; Supplier 1: LCSC; Supplier Part Number 1: C333585; JLCPCB Part Number: C333585; Power Rating: 1W; Category: Resistors; Package Size: 2512; JLCPCB Basic Part: Yes; Tolerance: ±5%; Voltage Rating: 200V; Temperature Coefficient: ±200ppm/℃; Temperature Rating: -55℃~+155℃; ComponentLink1Description: Datasheet; ComponentLink1URL: https://wmsc.lcsc.com/wmsc/upload/file/pdf/v2/lcsc/2304140030_RALEC-RTT252R7JTE_C333585.pdf; ComponentLink2Description: JLCPCB Part URL; ComponentLink2URL: https://jlcpcb.com/partdetail/C333585
pins: 1, 2
1 alternate drawing of the same symbol

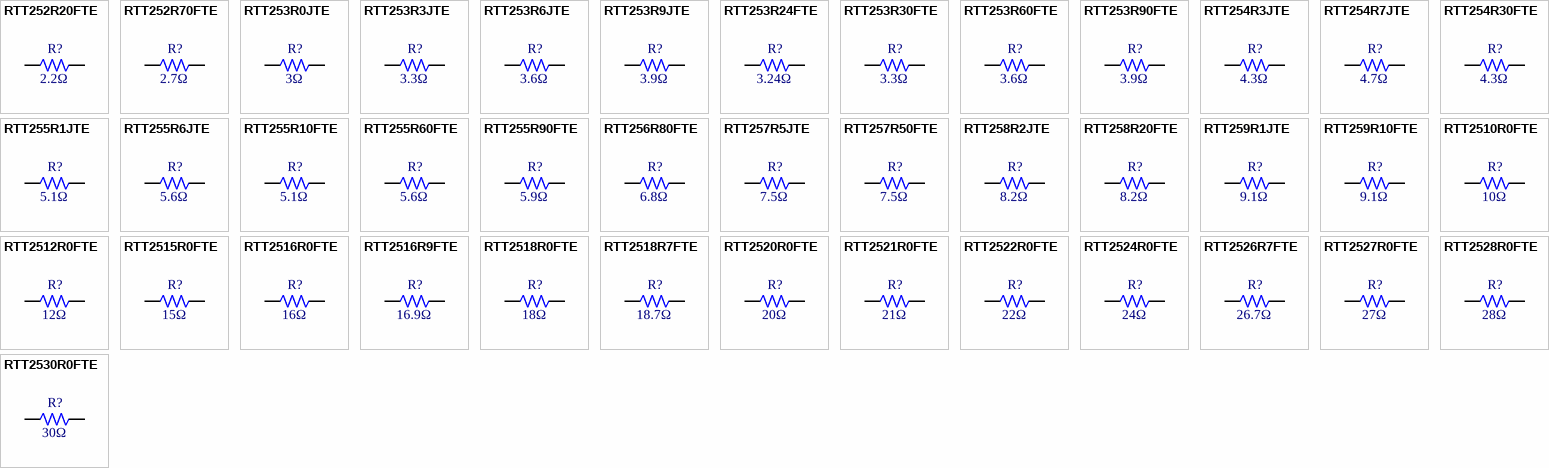
[diagram p55: symbols RTT252R20FTE to RTT2530R0FTE]

## RTT252R20FTE
designator R?  Resistance: 2.2Ω  (hidden comment: *)
Resistor, 2.2Ω, ±1%, 1W, 200V, ±200ppm/℃, -55℃~+155℃, SMD 2512; Manufacturer: Uniroyal; Manufacturer Part Number: RTT252R20FTE; Supplier 1: LCSC; Supplier Part Number 1: C458701; JLCPCB Part Number: C458701; Power Rating: 1W; Category: Resistors; Package Size: 2512; JLCPCB Basic Part: Yes; Tolerance: ±1%; Voltage Rating: 200V; Temperature Coefficient: ±200ppm/℃; Temperature Rating: -55℃~+155℃; ComponentLink1Description: Datasheet; ComponentLink1URL: https://wmsc.lcsc.com/wmsc/upload/file/pdf/v2/lcsc/2304140030_RALEC-RTT252R20FTE_C458701.pdf; ComponentLink2Description: JLCPCB Part URL; ComponentLink2URL: https://jlcpcb.com/partdetail/C458701
pins: 1, 2
1 alternate drawing of the same symbol

## RTT252R70FTE
designator R?  Resistance: 2.7Ω  (hidden comment: *)
Resistor, 2.7Ω, ±1%, 1W, 200V, ±200ppm/℃, -55℃~+155℃, SMD 2512; Manufacturer: Uniroyal; Manufacturer Part Number: RTT252R70FTE; Supplier 1: LCSC; Supplier Part Number 1: C333584; JLCPCB Part Number: C333584; Power Rating: 1W; Category: Resistors; Package Size: 2512; JLCPCB Basic Part: Yes; Tolerance: ±1%; Voltage Rating: 200V; Temperature Coefficient: ±200ppm/℃; Temperature Rating: -55℃~+155℃; ComponentLink1Description: Datasheet; ComponentLink1URL: https://wmsc.lcsc.com/wmsc/upload/file/pdf/v2/lcsc/2304140030_RALEC-RTT252R70FTE_C333584.pdf; ComponentLink2Description: JLCPCB Part URL; ComponentLink2URL: https://jlcpcb.com/partdetail/C333584
pins: 1, 2
1 alternate drawing of the same symbol